# Altium footprint library Zmod.PcbLib: 229 footprints (part 15 of 15)
Each footprint in its own frame and in the unit in brackets; x right, y up, seen from the top. Pads: shape width x height; smd on the part's side, far side on the other; paste and mask are expansions set on the pad; w line width, h text height; cw(c..) or ccw(c..) is an arc to the next point about the centre after c.
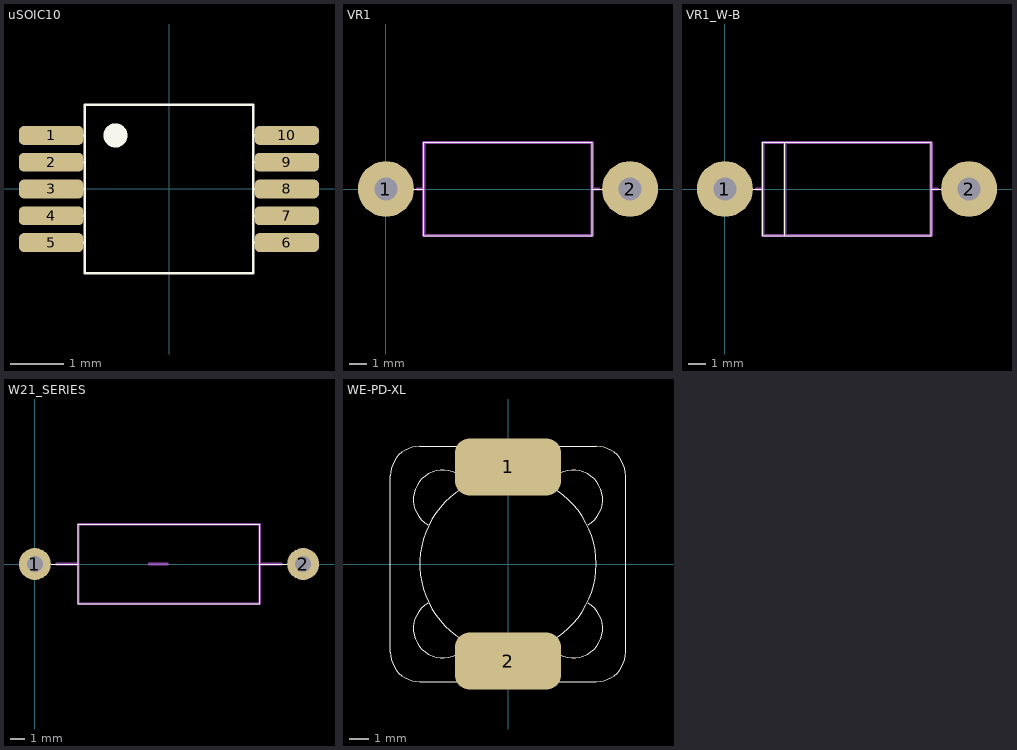
[diagram p14: the footprints below, top view; thin cyan lines are the x and y axes]

## uSOIC10 [mm] "Analog Devices 10-lead uSOIC RM-10 Rev.1"
height 1.1
pads (10):
  rrect50% 1.2x0.35 smd: 1(-2.2,1) 2(-2.2,0.5) 3(-2.2,0) 6(2.2,-1) 7(2.2,-0.5) 8(2.2,0) 9(2.2,0.5) 10(2.2,1)
  rrect50% 1.2x0.35 smd mask+0.102: 4(-2.2,-0.5) 5(-2.2,-1)
Top Overlay:
  circle w0.25: c-1,1 r0.1
  lines w0.05: -2.125,-1 -1.575,-1 ; -2.125,-0.5 -1.575,-0.5 ; -2.125,0 -1.575,0 ; -2.125,0.5 -1.575,0.5 ; -2.125,1 -1.575,1 ; 1.575,-1 2.125,-1 ; 1.575,-0.5 2.125,-0.5 ; 1.575,0 2.125,0 ; 1.575,0.5 2.125,0.5 ; 1.575,1 2.125,1 ; -1.575,-1.575 -1.575,1.575 1.575,1.575 1.575,-1.575 -1.575,-1.575
  text ".Designator" at -0.875,-0.3 h1.5

## VR1 [mm]
height 5.334
pads (2):
  round 3.2 / inner round 1.3 / far side round 3.2 hole 1.3: 1(0,0) 2(13.97,0)
Top Overlay:
  lines w0.05: 0,0 2.159,0 ; 11.811,0 13.97,0 ; 2.159,-2.667 11.811,-2.667 11.811,2.667 2.159,2.667 2.159,-2.667
Mechanical 15:
  lines w0.18: 1.778,0 2.159,0 ; 11.811,0 12.192,0 ; 2.159,-2.667 11.811,-2.667 11.811,2.667 2.159,2.667 2.159,-2.667
  text ".Designator" at 2.54,0.889 h1.5

## VR1_W-B [mm] "REV. 1"
height 5.334
pads (2):
  round 3.2 / inner round 1.3 / far side round 3.2 hole 1.3: 1(0,0) 2(13.97,0)
Top Overlay:
  lines w0.05: 0,0 2.159,0 ; 3.43,-2.647 3.43,2.667 ; 11.811,0 13.97,0 ; 2.159,-2.667 2.159,2.667 11.811,2.667 11.811,-2.667 2.159,-2.667
Mechanical 15:
  lines w0.18: 1.778,0 2.159,0 ; 3.43,-2.667 3.43,2.647 3.45,2.667 ; 11.811,0 12.192,0 ; 2.159,-2.667 2.159,2.667 11.811,2.667 11.811,-2.667 2.159,-2.667
  text ".Designator" at 2.54,0.889 h1.5

## W21_SERIES [mm] "Body 12.7x5.6mm, Pitch 18.5mm, Rev.1"
height 5.6
pads (2):
  round 2.2 hole 1.1: 1(0,0) 2(18.5,0)
Top Overlay:
  lines w0.05: 0,0 3,0 ; 15.5,0 18.5,0 ; 3,-2.75 3,2.75 15.5,2.75 15.5,-2.75 3,-2.75
Mechanical 15:
  lines w0.18: 1.5,0 3,0 ; 7.874,0 9.144,0 ; 15.5,0 17,0 ; 3,-2.75 3,2.75 15.5,2.75 15.5,-2.75 3,-2.75
  text ".Designator" at 2.663,-0.369 h1.5

## WE-PD-XL [mm] "Wurth, Rev. 1"
height 8
pads (2):
  rrect50% 5.4x2.9 smd: 1(0,4.95) 2(0,-4.95)
Top Overlay:
  circle w0.05: c0,0 r4.5
  lines w0.05: -4.1,-2 ccw(c-3.328,-3.286) -2.042,-4.058 ; -4.1,2 cw(c-3.328,3.286) -2.042,4.058 ; 2.042,-4.058 ccw(c3.328,-3.286) 4.1,-2 ; 2.042,4.058 cw(c3.328,3.286) 4.1,2 ; -6,-4.5 ccw(c-4.5,-4.5) -4.5,-6 4.5,-6 ccw(c4.5,-4.5) 6,-4.5 6,4.5 ccw(c4.5,4.5) 4.5,6 -4.5,6 ccw(c-4.5,4.5) -6,4.5 -6,-4.5
Mechanical 15:
  text ".Designator" at 0.35,-6.65 h1.5